# Altium footprint library ZJUDancer_Circuit_V4.1.PcbLib: 96 footprints (part 2 of 6)
Each footprint in its own frame and in the unit in brackets; x right, y up, seen from the top. Pads: shape width x height; smd on the part's side, far side on the other; paste and mask are expansions set on the pad; w line width, h text height; cw(c..) or ccw(c..) is an arc to the next point about the centre after c.
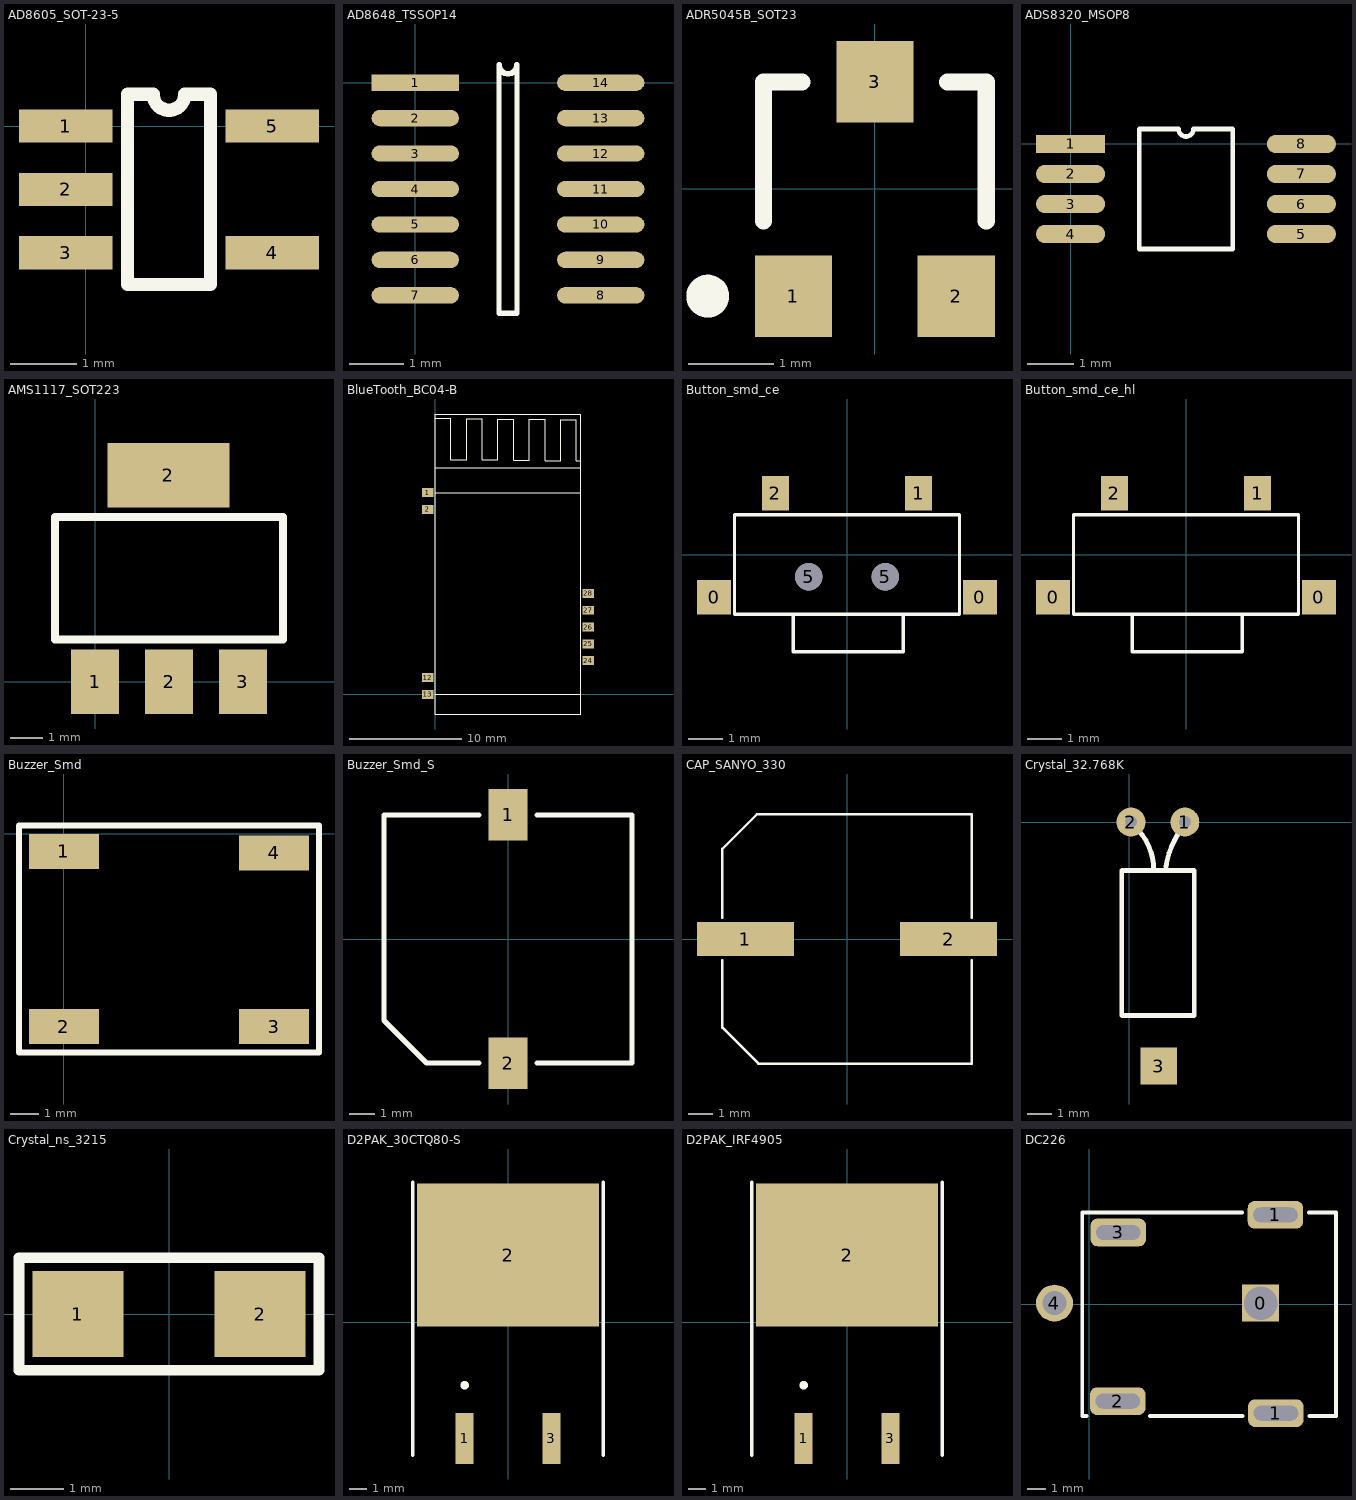
[diagram p1: the footprints below, top view; thin cyan lines are the x and y axes]

## AD8605_SOT-23-5 [mm]
pads (5):
  rect 1.4x0.5 smd: 1(-0.3,0) 2(-0.3,-0.95) 3(-0.3,-1.9) 4(2.8,-1.9) 5(2.8,0)
Top Overlay:
  lines w0.2: 0.627,-2.375 1.873,-2.375 1.873,0.475 1.488,0.475 cw(c1.25,0.475) 1.013,0.475 0.627,0.475 0.627,-2.375
3D body: height 1.2, standoff 0, extent -0.15,-2.4 2.65,0.5

## AD8648_TSSOP14 [mm]
pads (14):
  rect 1.6x0.3 smd: 1(0,0)
  oval 1.6x0.3 smd: 2(0,-0.65) 3(0,-1.3) 4(0,-1.95) 5(0,-2.6) 6(0,-3.25) 7(0,-3.9) 8(3.4,-3.9) 9(3.4,-3.25) 10(3.4,-2.6) 11(3.4,-1.95) 12(3.4,-1.3) 13(3.4,-0.65) 14(3.4,0)
Top Overlay:
  lines w0.1: 1.535,-4.225 1.535,0.325 1.538,0.325 ccw(c1.7,0.325) 1.862,0.325 1.865,0.325 1.865,-4.225 1.535,-4.225

## ADR5045B_SOT23 [mm]
pads (3):
  rect 0.9x0.95 smd: 1(-0.95,-1.25) 2(0.95,-1.25) 3(0,1.25)
Top Overlay:
  circle w0.25: c-1.95,-1.25 r0.125
  lines w0.2: -1.3,-0.375 -1.3,1.25 -0.85,1.25 ; 0.85,1.25 1.3,1.25 1.3,-0.375
3D body: height 1.2, standoff 0, extent -1.45,-1.475 1.45,1.325

## ADS8320_MSOP8 [mm]
pads (8):
  rect 1.5x0.4 smd: 1(0,0)
  oval 1.5x0.4 smd: 2(0,-0.65) 3(0,-1.3) 4(0,-1.95) 5(5,-1.95) 6(5,-1.3) 7(5,-0.65) 8(5,0)
Top Overlay:
  lines w0.1: 1.485,-2.275 3.515,-2.275 3.515,0.325 2.662,0.325 cw(c2.5,0.325) 2.338,0.325 1.485,0.325 1.485,-2.275
3D body: height 0.85, standoff -0.1, extent 0.025,-2.475 5.025,0.525

## AMS1117_SOT223 [mil]
pads (4):
  rect 59x79 smd: 1(0,0) 2(90.55,0) 3(181.1,0)
  rect 150x79 smd: 2(89.88,253.54)
Top Overlay:
  lines w10: -49.45,52 230.55,52 230.55,202 -49.45,202 -49.45,52
3D body: height 64.96, standoff 0, extent -32.71,-8.14 211.39,267.45

## BlueTooth_BC04-B [mm]
pads (9):
  rect 1x0.8 smd: 1(-0.65,18) 2(-0.65,16.5) 12(-0.65,1.5) 13(-0.65,0) 24(13.65,3) 25(13.65,4.5) 26(13.65,6) 27(13.65,7.5) 28(13.65,9)
Top Overlay:
  lines w0.1: 0,20.2 13,20.2 ; 0,24.6 1.4,24.6 1.4,20.925 2.8,20.925 2.8,24.575 4.2,24.575 4.2,20.9 5.6,20.9 5.6,24.55 7,24.55 7,20.875 8.4,20.875 8.4,24.525 9.8,24.525 9.8,20.85 11.2,20.85 11.2,24.5 12.6,24.5 12.6,20.825 13,20.825 ; 13,0 0,0 ; 13,18 0,18 ; 0,0 0,-1.75 13,-1.75 13,25 0,25 0,18 ; 0,0 0,18

## Button_smd_ce [mm]
pads (6):
  rect 1x1 smd: 0(-3.9,-1.25) 0(3.9,-1.25)
  rect 0.8x1 smd: 1(2.1,1.8) 2(-2.1,1.8)
  round 0.8 hole 0.8: 5(-1.125,-0.65) 5(1.125,-0.65)
Top Overlay:
  lines w0.1: -1.575,-1.75 -1.575,-2.85 1.65,-2.85 1.65,-1.75 ; -3.3,-1.75 3.3,-1.75 3.3,1.175 -3.3,1.175 -3.3,-1.75
3D body: height 3.42, standoff -0.78, extent -3.95,-2.7 3.85,2

## Button_smd_ce_hl [mm]
pads (4):
  rect 1x1 smd: 0(-3.9,-1.25) 0(3.9,-1.25)
  rect 0.8x1 smd: 1(2.1,1.8) 2(-2.1,1.8)
Top Overlay:
  lines w0.1: -1.575,-1.75 -1.575,-2.85 1.65,-2.85 1.65,-1.75 ; -3.3,-1.75 3.3,-1.75 3.3,1.175 -3.3,1.175 -3.3,-1.75
3D body: height 3.42, standoff -0.78, extent -3.95,-2.7 3.85,2

## Buzzer_Smd [mm]
pads (4):
  rect 2.5x1.25 smd: 1(0,-0.625) 2(0,-6.875) 3(7.5,-6.875) 4(7.5,-0.675)
Top Overlay:
  lines w0.2: -1.6,-7.8 9.1,-7.8 9.1,0.3 -1.6,0.3 -1.6,-7.8
3D body: height 2.53, standoff 0.02, extent 0,-7.55 7.5,-0.05

## Buzzer_Smd_S [mm]
pads (2):
  rect 1.5x2 smd: 1(0,4.8) 2(0,-4.8)
Top Overlay:
  lines w0.2: -1.125,-4.8 -3.15,-4.8 -4.8,-3.15 -4.8,4.8 -1.125,4.8 ; 1.125,-4.8 4.8,-4.8 4.8,4.8 1.125,4.8
3D body: height 5.52, standoff 0.02, extent -4.8,-4.9 4.8,4.9

## CAP_SANYO_330 [mm] "贴片电解电容"
pads (2):
  rect 4x1.4 smd: 1(-4.2,0) 2(4.2,0)
Top Overlay:
  lines w0.1: -5.15,-0.875 -5.15,-3.66 -3.66,-5.15 5.15,-5.15 5.15,-0.875 ; -5.15,0.875 -5.15,3.73 -3.73,5.15 5.15,5.15 5.15,0.875
3D body: height 10.13, standoff 0.02, extent -5.56,-5.15 5.54,5.15

## Crystal_32.768K [mm]
pads (3):
  round 1.2 hole 0.5: 1(2.293,0) 2(0.064,0)
  rect 1.524x1.524 smd: 3(1.21,-10.1)
Top Overlay:
  lines w0.2: 0,0 cw(c-1.433,-1.967) 1,-2 ; 1.511,-1.85 cw(c5.011,-2.35) 2.37,0 ; -0.32,-8 -0.32,-2 2.68,-2 2.68,-8 -0.32,-8
3D body: height 3, standoff -2, extent -0.32,-9.64 2.68,0.11

## Crystal_ns_3215 [mm]
height 2
pads (2):
  rect 1.7x1.6 smd: 1(-1.7,0) 2(1.7,0)
Top Overlay:
  lines w0.2: -2.8,-1.05 -2.8,1.05 2.8,1.05 2.8,-1.05 -2.8,-1.05
3D body: height 0.82, standoff 0.02, extent -1.6,-0.75 1.6,0.75

## D2PAK_30CTQ80-S [mm]
pads (3):
  rect 1.05x3 smd: 1(-2.54,-6.796) 3(2.54,-6.796)
  rect 10.668x8.382 smd: 2(0,3.937)
Top Overlay:
  circle w0.25: c-2.538,-3.683 r0.125
  lines w0.2: -5.575,-7.797 -5.575,8.203 ; 5.575,-7.797 5.575,8.203
3D body: height 4.45, standoff 0, extent -5.182,-7.805 5.233,7.305

## D2PAK_IRF4905 [mm]
pads (3):
  rect 1.05x3 smd: 1(-2.54,-6.796) 3(2.54,-6.796)
  rect 10.668x8.382 smd: 2(0,3.937)
Top Overlay:
  circle w0.25: c-2.538,-3.683 r0.125
  lines w0.2: -5.575,-7.797 -5.575,8.203 ; 5.575,-7.797 5.575,8.203
3D body: height 4.45, standoff 0, extent -5.182,-7.805 5.233,7.305

## DC226 [mm]
pads (6):
  rect 2x2 hole 1.8 square: 0(9.275,0.05)
  rrect50% 3x1.5 hole 0.8 slot 2.4 at 0 deg: 1(10.075,4.825) 1(10.1,-5.9) 2(1.55,-5.25) 3(1.575,3.875)
  round 2 hole 1.3: 4(-1.875,0.05)
Top Overlay:
  lines w0.203: -0.15,-6.05 -0.375,-6.05 -0.375,4.95 8.275,4.95 ; 3.275,-6.05 8.3,-6.05 ; 11.875,4.95 13.35,4.95 13.35,-6.05 11.9,-6.05
3D body: height 7.32, standoff -0.71, extent -2.4,-6.05 13.35,4.95